# Altium footprint library Printing.PcbLib: 48 footprints (part 3 of 3)
Each footprint in its own frame and in the unit in brackets; x right, y up, seen from the top. Pads: shape width x height; smd on the part's side, far side on the other; paste and mask are expansions set on the pad; w line width, h text height; cw(c..) or ccw(c..) is an arc to the next point about the centre after c.
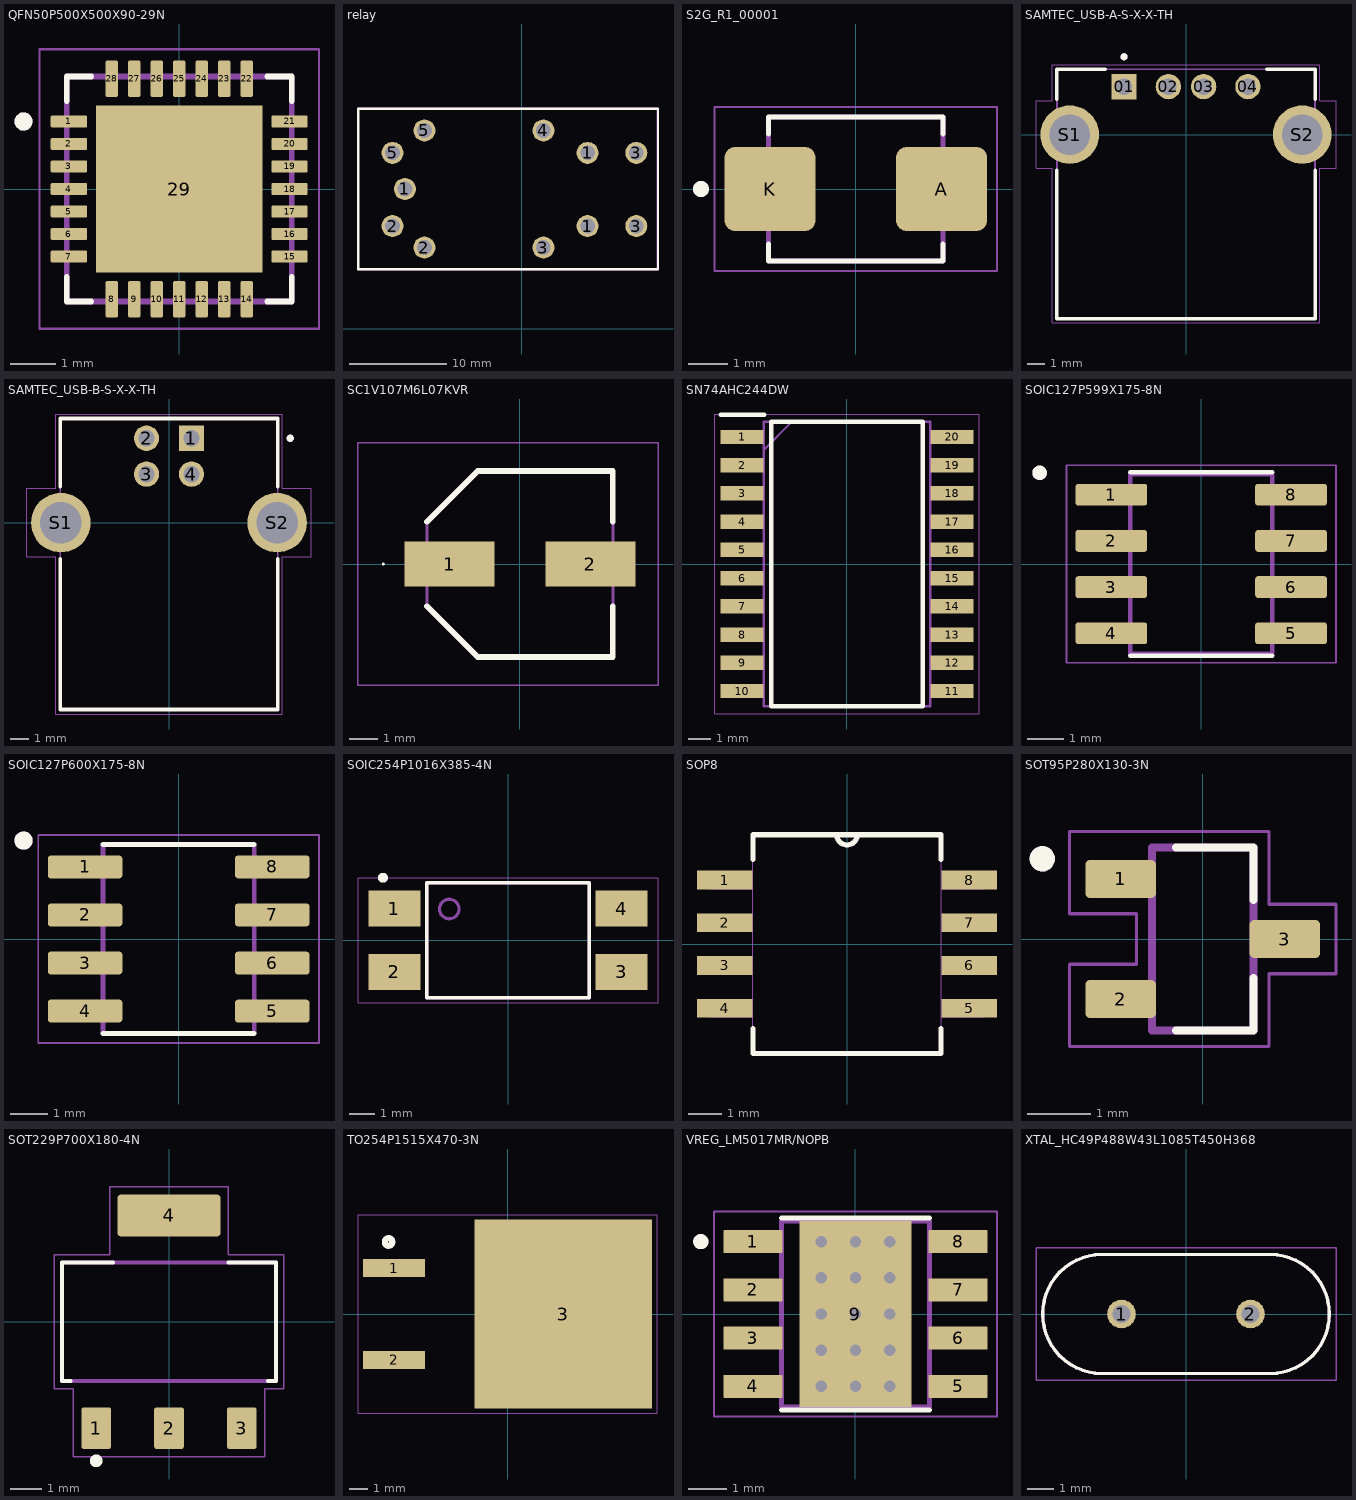
[diagram p2: the footprints below, top view; thin cyan lines are the x and y axes]

## QFN50P500X500X90-29N [mm]
height 0.9
pads (29):
  rrect25% 0.81x0.27 smd: 1(-2.45,1.5) 2(-2.45,1) 3(-2.45,0.5) 4(-2.45,0) 5(-2.45,-0.5) 6(-2.45,-1) 7(-2.45,-1.5) 15(2.45,-1.5) 16(2.45,-1) 17(2.45,-0.5) 18(2.45,0) 19(2.45,0.5) 20(2.45,1) 21(2.45,1.5)
  rrect25% 0.27x0.81 smd: 8(-1.5,-2.45) 9(-1,-2.45) 10(-0.5,-2.45) 11(0,-2.45) 12(0.5,-2.45) 13(1,-2.45) 14(1.5,-2.45) 22(1.5,2.45) 23(1,2.45) 24(0.5,2.45) 25(0,2.45) 26(-0.5,2.45) 27(-1,2.45) 28(-1.5,2.45)
  rect 3.7x3.7 smd paste-0.68: 29(0,0)
Top Overlay:
  circle w0.2: c-3.46,1.5 r0.1
  lines w0.127: -2.5,-1.955 -2.5,-2.5 -1.955,-2.5 ; -2.5,1.955 -2.5,2.5 -1.955,2.5 ; 1.955,-2.5 2.5,-2.5 2.5,-1.955 ; 1.955,2.5 2.5,2.5 2.5,1.955
Mechanical 13:
  circle w0.2: c-3.46,1.5 r0.1
  lines w0.127: -2.5,-2.5 -2.5,2.5 2.5,2.5 2.5,-2.5 -2.5,-2.5
Mechanical 15:
  lines w0.05: -3.105,-3.105 -3.105,3.105 3.105,3.105 3.105,-3.105 -3.105,-3.105
3D body "TMC2209-LA.stp": height 0.9, standoff 0, extent -2.55,-2.55 2.55,2.55

## relay [mm]
pads (11):
  round 2.25 hole 1.5: 1(-11.951,14.351) 1(6.775,10.554) 1(6.775,18.054) 2(-13.225,10.554) 2(-9.951,8.351) 3(2.249,8.351) 3(11.775,10.554) 3(11.775,18.054) 4(2.249,20.351) 5(-13.225,18.054) 5(-9.951,20.351)
Top Overlay:
  lines w0.254: -16.739,6.101 13.995,6.101 13.995,22.601 -16.739,22.601 -16.739,6.101
Mechanical 13:
  lines w0.254: -16.764,6.101 -16.764,22.601 13.97,22.601 13.97,6.101 -16.764,6.101
3D body "G5RL-1-E-HR DC24--3DModel-STEP-1(1).STEP": height 15.7, standoff -3.5, extent -15.592,8.052 13.408,20.752

## S2G_R1_00001 [mm]
pads (2):
  rrect25% 2.29x2.12 smd: A(2.16,0) K(-2.16,0)
Top Overlay:
  circle w0.2: c-3.9,0 r0.1
  lines w0.127: -2.2,-1.38 -2.2,-1.813 2.2,-1.813 2.2,-1.38 ; -2.2,1.38 -2.2,1.813 2.2,1.813 2.2,1.38
Mechanical 13:
  circle w0.2: c-3.9,0 r0.1
  lines w0.127: -2.2,-1.813 -2.2,1.813 2.2,1.813 2.2,-1.813 -2.2,-1.813
Mechanical 15:
  lines w0.05: -3.555,-2.063 -3.555,2.063 3.555,2.063 3.555,-2.063 -3.555,-2.063
3D body "step_temp.STEP": height 2.65, standoff 0, extent -2.67,-1.813 2.67,1.813

## SAMTEC_USB-A-S-X-X-TH [mm]
pads (6):
  rect 1.428x1.428 hole 0.92: 01(-3.5,2.71)
  round 1.428 hole 0.92: 02(-1,2.71) 03(1,2.71) 04(3.5,2.71)
  round 3.316 hole 2.3: S1(-6.57,0) S2(6.57,0)
Top Overlay:
  circle w0.2: c-3.5,4.4 r0.1
  lines w0.2: -7.3,-2.01 -7.3,-10.4 7.3,-10.4 7.3,-2.01 ; -7.3,2.01 -7.3,3.7 -4.565,3.7 ; 4.565,3.7 7.3,3.7 7.3,2.01
Mechanical 13:
  circle w0.2: c-3.5,4.4 r0.1
  lines w0.1: -7.3,-10.4 -7.3,3.7 7.3,3.7 7.3,-10.4 -7.3,-10.4
Mechanical 15:
  lines w0.05: -8.48,-1.91 -8.48,1.91 -7.55,1.91 -7.55,3.95 7.55,3.95 7.55,1.91 8.48,1.91 8.48,-1.91 7.55,-1.91 7.55,-10.65 -7.55,-10.65 -7.55,-1.91 -8.48,-1.91
3D body "USB-A-S-F-B-TH.stp": height 7.47, standoff -4.42, extent -7.874,-10.544 7.874,3.556

## SAMTEC_USB-B-S-X-X-TH [mm]
pads (6):
  rect 1.408x1.408 hole 0.9: 1(1.25,4.7)
  round 1.408 hole 0.9: 2(-1.25,4.7) 3(-1.25,2.7) 4(1.25,2.7)
  round 3.316 hole 2.3: S1(-6.02,0) S2(6.02,0)
Top Overlay:
  circle w0.2: c6.75,4.7 r0.1
  lines w0.2: -6.05,-2.01 -6.05,-10.4 6.05,-10.4 6.05,-2.01 ; -6.05,2.01 -6.05,5.8 6.05,5.8 6.05,2.01
Mechanical 13:
  circle w0.2: c6.75,4.7 r0.1
  lines w0.1: -6.05,-10.4 6.05,-10.4 6.05,5.8 -6.05,5.8 -6.05,-10.4
Mechanical 15:
  lines w0.05: -7.93,-1.91 -6.3,-1.91 -6.3,-10.65 6.3,-10.65 6.3,-1.91 7.93,-1.91 7.93,1.91 6.3,1.91 6.3,6.05 -6.3,6.05 -6.3,1.91 -7.93,1.91 -7.93,-1.91
3D body "USB-B-S-F-W-TH-TR.stp": height 10.7, standoff -3.74, extent -7.36,-10.55 7.14,5.95

## SC1V107M6L07KVR [mm]
pads (2):
  rect 3.2x1.6 smd: 1(-2.5,0) 2(2.5,0)
Top Overlay:
  lines w0.05: -4.875,0 ccw(c-4.85,0) -4.825,0 ccw(c-4.85,0) -4.875,0
  lines w0.2: -3.3,-1.5 -1.5,-3.3 3.3,-3.3 3.3,-1.5 ; -3.3,1.5 -1.5,3.3 3.3,3.3 3.3,1.5
Mechanical 13:
  lines w0.1: -3.3,1.5 -1.5,3.3 ; -3.3,1.5 -3.3,-1.5 -1.5,-3.3 3.3,-3.3 3.3,3.3 -1.5,3.3 ; -3.3,1.5 -1.5,3.3
Mechanical 15:
  lines w0.05: -5.75,-4.3 4.9,-4.3 4.9,4.3 -5.75,4.3 -5.75,-4.3
3D body "EEE-FN1V101XL.STEP": height 7.7, standoff 0, extent -3.65,-3.3 3.65,3.3

## SN74AHC244DW [mm]
pads (20):
  rect 1.95x0.65 smd: 1(-4.725,5.715) 2(-4.725,4.445) 3(-4.725,3.175) 4(-4.725,1.905) 5(-4.725,0.635) 6(-4.725,-0.635) 7(-4.725,-1.905) 8(-4.725,-3.175) 9(-4.725,-4.445) 10(-4.725,-5.715) 11(4.725,-5.715) 12(4.725,-4.445) 13(4.725,-3.175) 14(4.725,-1.905) 15(4.725,-0.635) 16(4.725,0.635) 17(4.725,1.905) 18(4.725,3.175) 19(4.725,4.445) 20(4.725,5.715)
Top Overlay:
  lines w0.2: -5.68,6.72 -3.73,6.72 ; -3.4,-6.4 3.4,-6.4 3.4,6.4 -3.4,6.4 -3.4,-6.4
Mechanical 13:
  lines w0.1: -3.75,5.13 -2.48,6.4 ; -3.75,-6.4 3.75,-6.4 3.75,6.4 -3.75,6.4 -3.75,-6.4
Mechanical 15:
  lines w0.05: -5.95,-6.75 5.95,-6.75 5.95,6.75 -5.95,6.75 -5.95,-6.75
3D body "SN74AHC244DW.stp": height 1.75, standoff 0, extent -5.165,-6.4 5.165,6.4

## SOIC127P599X175-8N [mm]
pads (8):
  rrect25% 1.97x0.6 smd: 1(-2.47,1.905) 2(-2.47,0.635) 3(-2.47,-0.635) 4(-2.47,-1.905) 5(2.47,-1.905) 6(2.47,-0.635) 7(2.47,0.635) 8(2.47,1.905)
Top Overlay:
  circle w0.2: c-4.44,2.505 r0.1
  lines w0.127: -1.95,-2.525 1.95,-2.525 ; -1.95,2.525 1.95,2.525
Mechanical 13:
  circle w0.2: c-4.44,2.505 r0.1
  lines w0.127: -1.95,-2.462 -1.95,2.462 1.95,2.462 1.95,-2.462 -1.95,-2.462
Mechanical 15:
  lines w0.05: -3.705,-2.712 -3.705,2.712 3.705,2.712 3.705,-2.712 -3.705,-2.712
3D body "AT24CS64-SSHM-B.STEP": height 1.75, standoff 0, extent -3,-2.45 3,2.45

## SOIC127P600X175-8N [mm]
pads (8):
  rrect25% 1.97x0.6 smd: 1(-2.475,1.905) 2(-2.475,0.635) 3(-2.475,-0.635) 4(-2.475,-1.905) 5(2.475,-1.905) 6(2.475,-0.635) 7(2.475,0.635) 8(2.475,1.905)
Top Overlay:
  circle w0.24: c-4.1,2.6 r0.12
  lines w0.127: -2,-2.5 2,-2.5 ; -2,2.5 2,2.5
Mechanical 13:
  circle w0.24: c-4.1,2.6 r0.12
  lines w0.127: -2,-2.5 2,-2.5 2,2.5 -2,2.5 -2,-2.5
Mechanical 15:
  lines w0.05: -3.71,-2.75 3.71,-2.75 3.71,2.75 -3.71,2.75 -3.71,-2.75
3D body "IR2184S.STEP": height 1.75, standoff 0, extent -3,-2.5 3,2.5

## SOIC254P1016X385-4N [mm]
pads (4):
  rect 2.09x1.44 smd: 1(-4.54,1.27) 2(-4.54,-1.27) 3(4.54,-1.27) 4(4.54,1.27)
Top Overlay:
  circle w0.2: c-5,2.5 r0.1
  lines w0.127: -3.25,-2.3 -3.25,2.3 3.25,2.3 3.25,-2.3 -3.25,-2.3
Mechanical 13:
  circle w0.127: c-2.35,1.25 r0.391
  lines w0.127: -3.25,-2.3 -3.25,2.3 3.25,2.3 3.25,-2.3 -3.25,-2.3
Mechanical 15:
  lines w0.05: -6,-2.5 -6,2.5 6,2.5 6,-2.5 -6,-2.5

## SOP8 [mil]
pads (8):
  rect 65x22 smd: 1(-143,75) 2(-143,25) 3(-143,-25) 4(-143,-75) 5(143,-75) 6(143,-25) 7(143,25) 8(143,75)
Top Overlay:
  lines w6: -110,-99 -110,-128 110,-128 110,-99 ; -110,99 -110,128 -12,128 ; 110,99 110,128 12,128 ; -12,128 ccw(c0,128) 12,128 ; -12,128 12,128
Mechanical 13:
  lines w0: -12,128 ccw(c0,128) 12,128 ; -12,128 -110,128 -110,-128 110,-128 110,128 12,128 ; -12,128 12,128 ; -161,-85 -110,-85 -110,-65 -161,-65 -161,-85 ; -161,-35 -110,-35 -110,-15 -161,-15 -161,-35 ; -161,15 -110,15 -110,35 -161,35 -161,15 ; -161,65 -110,65 -110,85 -161,85 -161,65 ; 110,-85 161,-85 161,-65 110,-65 110,-85 ; 110,-35 161,-35 161,-15 110,-15 110,-35 ; 110,15 161,15 161,35 110,35 110,15 ; 110,65 161,65 161,85 110,85 110,65
3D body "step_temp.STEP": height 78.74, standoff 0, extent -153.56,-122.05 153.53,122.04

## SOT95P280X130-3N [mm]
pads (3):
  rrect25% 1.12x0.6 smd: 1(-1.3,0.95) 2(-1.3,-0.95) 3(1.3,0)
Top Overlay:
  circle w0.2: c-2.54,1.27 r0.1
  lines w0.127: -0.42,-1.45 0.8,-1.45 0.8,-0.62 ; -0.42,1.45 0.8,1.45 0.8,0.62
Mechanical 13:
  circle w0.2: c-2.54,1.27 r0.1
  lines w0.127: -0.8,-1.45 -0.8,1.45 0.8,1.45 0.8,-1.45 -0.8,-1.45
Mechanical 15:
  lines w0.05: -2.11,-1.7 1.05,-1.7 1.05,-0.55 2.11,-0.55 2.11,0.55 1.05,0.55 1.05,1.7 -2.11,1.7 -2.11,0.4 -1.05,0.4 -1.05,-0.4 -2.11,-0.4 -2.11,-1.7

## SOT229P700X180-4N [mm]
pads (4):
  rrect15% 0.93x1.31 smd: 1(-2.29,-3.345) 2(0,-3.345) 3(2.29,-3.345)
  rrect15% 3.24x1.31 smd: 4(0,3.345)
Top Overlay:
  circle w0.2: c-2.29,-4.373 r0.1
  lines w0.127: -3.1,-1.86 -3.36,-1.86 -3.36,1.86 -1.76,1.86 ; 1.87,1.86 3.36,1.86 3.36,-1.86 3.11,-1.86
Mechanical 13:
  lines w0.127: -3.36,-1.86 3.36,-1.86 3.36,1.86 -3.36,1.86 -3.36,-1.86
Mechanical 15:
  lines w0.05: -3.61,-2.11 -3.01,-2.11 -3.01,-4.25 3.01,-4.25 3.01,-2.11 3.61,-2.11 3.61,2.11 1.87,2.11 1.87,4.25 -1.87,4.25 -1.87,2.11 -3.61,2.11 -3.61,-2.11
3D body "AMS1117-3.3--3DModel-STEP-56544.STEP": height 1.8, standoff 0, extent -3.252,-3.438 3.25,3.56

## TO254P1515X470-3N [mm]
pads (3):
  rect 3.45x1 smd: 1(-6.3,2.54) 2(-6.3,-2.54)
  rect 9.85x10.5 smd paste-6: 3(3.1,0)
Top Overlay:
  circle w0.2: c-6.6,4 r0.141
  circle w0.2: c-6.6,4 r0.283
Top Paste:
  region: 7.1,-4.765 5.747,-4.765 5.747,-3.24 7.1,-3.24
  region: 4.98,-4.761 3.621,-4.761 3.621,-3.24 4.98,-3.24
  region: 2.83,-4.761 1.47,-4.761 1.47,-3.24 2.83,-3.24
  region: 0.68,-4.763 -0.68,-4.763 -0.68,-3.24 0.68,-3.24
  region: 7.1,-2.761 5.743,-2.761 5.743,-1.24 7.1,-1.24
  region: 4.98,-2.765 3.626,-2.765 3.626,-1.24 4.98,-1.24
  region: 2.83,-2.762 1.471,-2.762 1.471,-1.24 2.83,-1.24
  region: 0.68,-2.765 -0.681,-2.765 -0.681,-1.24 0.68,-1.24
  region: 7.1,-0.76 5.741,-0.76 5.741,0.76 7.1,0.76
  region: 4.98,-0.761 3.625,-0.761 3.625,0.76 4.98,0.76
  region: 2.83,-0.761 1.472,-0.761 1.472,0.76 2.83,0.76
  region: 0.68,-0.761 -0.681,-0.761 -0.681,0.76 0.68,0.76
  region: 7.1,1.242 5.75,1.242 5.75,2.76 7.1,2.76
  region: 4.98,1.242 3.626,1.242 3.626,2.76 4.98,2.76
  region: 2.83,1.242 1.473,1.242 1.473,2.76 2.83,2.76
  region: 0.68,1.242 -0.681,1.242 -0.681,2.76 0.68,2.76
  region: 7.1,3.24 5.741,3.24 5.741,4.76 7.1,4.76
  region: 4.98,3.246 3.627,3.246 3.627,4.76 4.98,4.76
  region: 2.83,3.241 1.471,3.241 1.471,4.76 2.83,4.76
  region: 0.68,3.244 -0.681,3.244 -0.681,4.76 0.68,4.76
Mechanical 15:
  lines w0.05: -8.3,-5.5 -8.3,5.5 8.3,5.5 8.3,-5.5 -8.3,-5.5
3D body "L7805ACD2T-TR.STEP": height 4.6, standoff -0.23, extent -7.673,-5.161 7.752,5.039

## VREG_LM5017MR/NOPB [mm]
pads (9):
  rrect5% 1.55x0.6 smd mask+0: 1(-2.7,1.905) 2(-2.7,0.635) 3(-2.7,-0.635) 4(-2.7,-1.905) 5(2.7,-1.905) 6(2.7,-0.635) 7(2.7,0.635) 8(2.7,1.905)
  rect 2.95x4.9 smd paste-3 mask+0: 9(0,0)
via -0.9,1.9 diameter 0.5 hole 0.3
via 0,1.9 diameter 0.5 hole 0.3
via 0.9,1.9 diameter 0.5 hole 0.3
via -0.9,0.95 diameter 0.5 hole 0.3
via 0,0.95 diameter 0.5 hole 0.3
via 0.9,0.95 diameter 0.5 hole 0.3
via -0.9,0 diameter 0.5 hole 0.3
via 0,0 diameter 0.5 hole 0.3
via 0.9,0 diameter 0.5 hole 0.3
via -0.9,-0.95 diameter 0.5 hole 0.3
via 0,-0.95 diameter 0.5 hole 0.3
via 0.9,-0.95 diameter 0.5 hole 0.3
via -0.9,-1.9 diameter 0.5 hole 0.3
via 0,-1.9 diameter 0.5 hole 0.3
via 0.9,-1.9 diameter 0.5 hole 0.3
Top Overlay:
  circle w0.2: c-4.07,1.905 r0.1
  lines w0.127: -1.95,-2.525 1.95,-2.525 ; -1.95,2.525 1.95,2.525
Top Paste:
  region: 1.355,-1.7 -1.355,-1.7 -1.355,1.7 1.355,1.7
Top Solder:
  drawing of 9 lines, arcs and shapes, not listed
Mechanical 13:
  circle w0.2: c-4.07,1.905 r0.1
  lines w0.127: -1.95,-2.45 1.95,-2.45 1.95,2.45 -1.95,2.45 -1.95,-2.45
Mechanical 15:
  lines w0.05: -3.725,-2.7 3.725,-2.7 3.725,2.7 -3.725,2.7 -3.725,-2.7
3D body "LM5017MR_NOPB.stp": height 1.57, standoff 0, extent -3.014,-2.45 3.014,2.45

## XTAL_HC49P488W43L1085T450H368 [mm]
pads (2):
  round 1.08 hole 0.68: 1(-2.44,0) 2(2.44,0)
Top Overlay:
  lines w0.127: -5.425,0 ccw(c-3.175,0) -3.175,-2.25 3.175,-2.25 ccw(c3.175,0) 5.425,0 ccw(c3.175,0) 3.175,2.25 -3.175,2.25 ccw(c-3.175,0) -5.425,0
Mechanical 13:
  lines w0.127: -5.425,0 ccw(c-3.175,0) -3.175,-2.25 3.175,-2.25 ccw(c3.175,0) 5.425,0 ccw(c3.175,0) 3.175,2.25 -3.175,2.25 ccw(c-3.175,0) -5.425,0
Mechanical 15:
  lines w0.05: -5.675,-2.5 5.675,-2.5 5.675,2.5 -5.675,2.5 -5.675,-2.5
3D body "ATS08A-E--3DModel-STEP-56544.STEP": height 3.68, standoff -12.7, extent -5.425,-2.25 5.425,2.25